# Altium footprint library con-molex.PCBLIB: 369 footprints (part 13 of 26)
Each footprint in its own frame and in the unit in brackets; x right, y up, seen from the top. Pads: shape width x height; smd on the part's side, far side on the other; paste and mask are expansions set on the pad; w line width, h text height; cw(c..) or ccw(c..) is an arc to the next point about the centre after c.
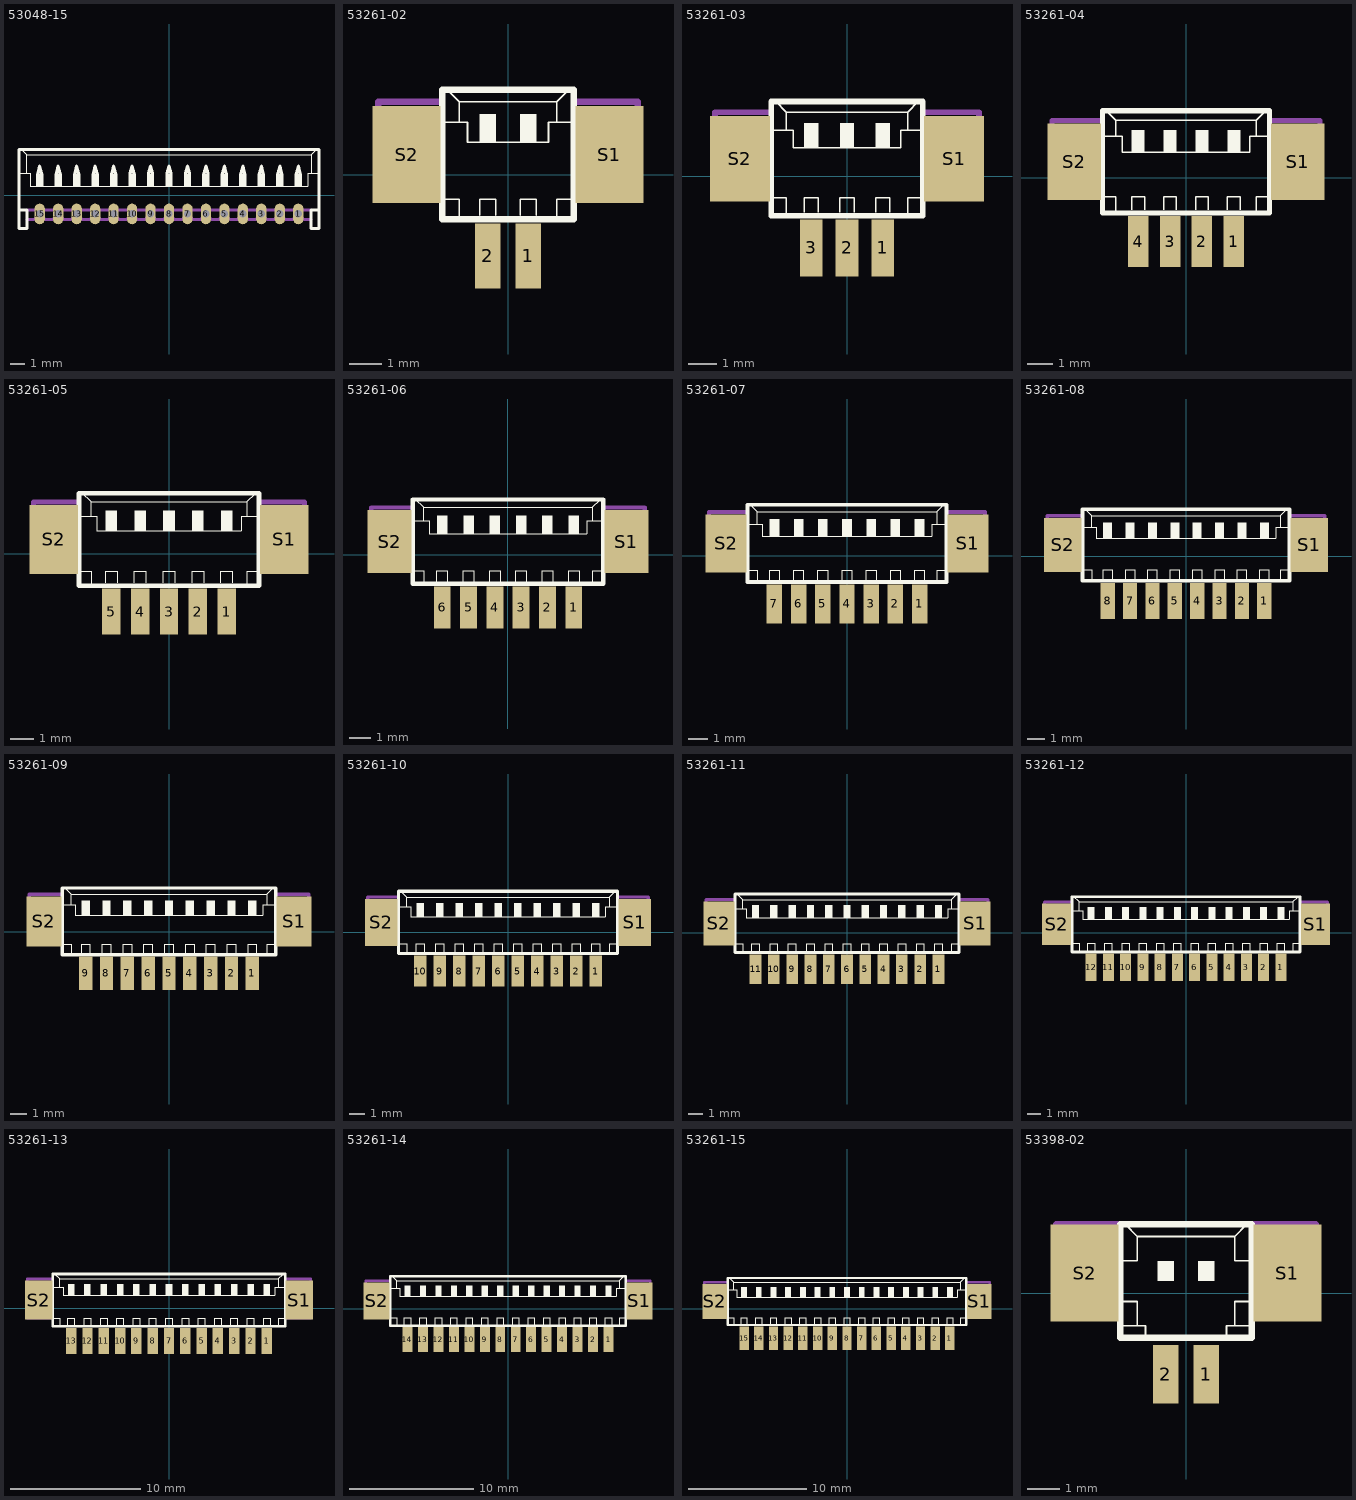
[diagram p12: the footprints below, top view; thin cyan lines are the x and y axes]

## 53048-15 [mil]
pads (15):
  oval 27.5x55 hole 19.69: 1(344.49,-49.21) 2(295.28,-49.21) 3(246.06,-49.21) 4(196.85,-49.21) 5(147.64,-49.21) 6(98.43,-49.21) 7(49.21,-49.21) 8(0,-49.21) 9(-49.21,-49.21) 10(-98.43,-49.21) 11(-147.64,-49.21) 12(-196.85,-49.21) 13(-246.06,-49.21) 14(-295.28,-49.21) 15(-344.49,-49.21)
Top Overlay:
  rectangle: -354.33,24.61 -334.65,59.06
  rectangle: -305.12,24.61 -285.43,59.06
  rectangle: -255.91,24.61 -236.22,59.06
  rectangle: -206.69,24.61 -187.01,59.06
  rectangle: -157.48,24.61 -137.8,59.06
  rectangle: -108.27,24.61 -88.58,59.06
  rectangle: -59.06,24.61 -39.37,59.06
  rectangle: -9.84,24.61 9.84,59.06
  rectangle: 39.37,24.61 59.06,59.06
  rectangle: 88.58,24.61 108.27,59.06
  rectangle: 137.8,24.61 157.48,59.06
  rectangle: 187.01,24.61 206.69,59.06
  rectangle: 236.22,24.61 255.91,59.06
  rectangle: 285.43,24.61 305.12,59.06
  rectangle: 334.65,24.61 354.33,59.06
  lines w2: -398.62,59.06 -378.94,59.06 ; -393.7,123.03 -378.94,108.27 ; 393.7,123.03 378.94,108.27 ; 398.62,59.06 378.94,59.06 ; -378.94,59.06 -369.09,59.06 -369.09,24.61 369.09,24.61 369.09,59.06 378.94,59.06 ; -378.94,59.06 -378.94,108.27 ; -378.94,108.27 378.94,108.27 ; 378.94,59.06 378.94,108.27
  lines w8: -398.62,-39.37 -378.94,-39.37 -378.94,-88.58 -399.61,-88.58 -399.61,123.03 -393.7,123.03 393.7,123.03 399.61,123.03 399.61,-88.58 378.94,-88.58 378.94,-39.37 398.62,-39.37 ; -349.41,59.06 -344.49,78.74 -339.57,59.06 ; -300.2,59.06 -295.28,78.74 -290.35,59.06 ; -250.98,59.06 -246.06,78.74 -241.14,59.06 ; -201.77,59.06 -196.85,78.74 -191.93,59.06 ; -152.56,59.06 -147.64,78.74 -142.72,59.06 ; -103.35,59.06 -98.43,78.74 -93.5,59.06 ; -54.13,59.06 -49.21,78.74 -44.29,59.06 ; -4.92,59.06 0,78.74 4.92,59.06 ; 44.29,59.06 49.21,78.74 54.13,59.06 ; 93.5,59.06 98.43,78.74 103.35,59.06 ; 142.72,59.06 147.64,78.74 152.56,59.06 ; 191.93,59.06 196.85,78.74 201.77,59.06 ; 241.14,59.06 246.06,78.74 250.98,59.06 ; 290.35,59.06 295.28,78.74 300.2,59.06 ; 339.57,59.06 344.49,78.74 349.41,59.06
Mechanical 16:
  rectangle: -354.33,-59.06 -334.65,-39.37
  rectangle: -305.12,-59.06 -285.43,-39.37
  rectangle: -255.91,-59.06 -236.22,-39.37
  rectangle: -206.69,-59.06 -187.01,-39.37
  rectangle: -157.48,-59.06 -137.8,-39.37
  rectangle: -108.27,-59.06 -88.58,-39.37
  rectangle: -59.06,-59.06 -39.37,-39.37
  rectangle: -9.84,-59.06 9.84,-39.37
  rectangle: 39.37,-59.06 59.06,-39.37
  rectangle: 88.58,-59.06 108.27,-39.37
  rectangle: 137.8,-59.06 157.48,-39.37
  rectangle: 187.01,-59.06 206.69,-39.37
  rectangle: 236.22,-59.06 255.91,-39.37
  rectangle: 285.43,-59.06 305.12,-39.37
  rectangle: 334.65,-59.06 354.33,-39.37
  lines w8: -378.94,-63.98 -359.25,-63.98 -354.33,-59.06 ; -378.94,-39.37 378.94,-39.37 ; -334.65,-59.06 -329.72,-63.98 -310.04,-63.98 -305.12,-59.06 ; -285.43,-59.06 -280.51,-63.98 -260.83,-63.98 -255.91,-59.06 ; -236.22,-59.06 -231.3,-63.98 -211.61,-63.98 -206.69,-59.06 ; -187.01,-59.06 -182.09,-63.98 -162.4,-63.98 -157.48,-59.06 ; -137.8,-59.06 -132.87,-63.98 -113.19,-63.98 -108.27,-59.06 ; -88.58,-59.06 -83.66,-63.98 -63.98,-63.98 -59.06,-59.06 ; -39.37,-59.06 -34.45,-63.98 -14.76,-63.98 -9.84,-59.06 ; 9.84,-59.06 14.76,-63.98 34.45,-63.98 39.37,-59.06 ; 59.06,-59.06 63.98,-63.98 83.66,-63.98 88.58,-59.06 ; 108.27,-59.06 113.19,-63.98 132.87,-63.98 137.8,-59.06 ; 157.48,-59.06 162.4,-63.98 182.09,-63.98 187.01,-59.06 ; 206.69,-59.06 211.61,-63.98 231.3,-63.98 236.22,-59.06 ; 255.91,-59.06 260.83,-63.98 280.51,-63.98 285.43,-59.06 ; 305.12,-59.06 310.04,-63.98 329.72,-63.98 334.65,-59.06 ; 354.33,-59.06 359.25,-63.98 378.94,-63.98

## 53261-02 [mm]
pads (4):
  rect 0.8x2 smd: 1(0.625,-2.5) 2(-0.625,-2.5)
  rect 2.1x3 smd: S1(3.125,0.625) S2(-3.125,0.625)
Top Overlay:
  rectangle: -0.875,1 -0.375,1.875
  rectangle: 0.375,1 0.875,1.875
  lines w0.051: -2,-0.75 -1.5,-0.75 -1.5,-1.375 ; -2,1.625 -1.5,1.625 ; -1.875,2.625 -1.5,2.25 ; -0.875,-1.25 -0.875,-0.75 -0.375,-0.75 -0.375,-1.25 ; 0.375,-1.25 0.375,-0.75 0.875,-0.75 0.875,-1.25 ; 1.5,-1.375 1.5,-0.75 2,-0.75 ; 1.875,2.625 1.5,2.25 ; 2,1.625 1.5,1.625 ; -1.5,1.625 -1.25,1.625 -1.25,1 1.25,1 1.25,1.625 1.5,1.625 ; -1.5,1.625 -1.5,2.25 ; -1.5,2.25 1.5,2.25 ; 1.5,1.625 1.5,2.25
  lines w0.203: -2.025,-1.375 -1.5,-1.375 1.5,-1.375 2.025,-1.375 2.025,2.625 1.875,2.625 -1.875,2.625 -2.025,2.625 -2.025,-1.375
Mechanical 16:
  lines w0.203: -2.125,-0.75 -4,-0.75 -4,2.25 -2.125,2.25 ; 2.125,-0.75 4,-0.75 4,2.25 2.125,2.25
  text "1" at 2.5,-0.25 h2.99

## 53261-03 [mm]
pads (5):
  rect 0.8x2 smd: 1(1.25,-2.5) 2(0,-2.5) 3(-1.25,-2.5)
  rect 2.1x3 smd: S1(3.75,0.625) S2(-3.75,0.625)
Top Overlay:
  rectangle: -1.5,1 -1,1.875
  rectangle: -0.25,1 0.25,1.875
  rectangle: 1,1 1.5,1.875
  lines w0.051: -2.625,-0.75 -2.125,-0.75 -2.125,-1.375 ; -2.625,1.625 -2.125,1.625 ; -2.5,2.625 -2.125,2.25 ; -1.5,-1.25 -1.5,-0.75 -1,-0.75 -1,-1.25 ; -0.25,-1.25 -0.25,-0.75 0.25,-0.75 0.25,-1.25 ; 1,-1.25 1,-0.75 1.5,-0.75 1.5,-1.25 ; 2.125,-1.375 2.125,-0.75 2.625,-0.75 ; 2.5,2.625 2.125,2.25 ; 2.625,1.625 2.125,1.625 ; -2.125,1.625 -1.875,1.625 -1.875,1 1.875,1 1.875,1.625 2.125,1.625 ; -2.125,1.625 -2.125,2.25 ; -2.125,2.25 2.125,2.25 ; 2.125,1.625 2.125,2.25
  lines w0.203: -2.65,-1.375 -2.125,-1.375 2.125,-1.375 2.65,-1.375 2.65,2.625 2.5,2.625 -2.5,2.625 -2.65,2.625 -2.65,-1.375
Mechanical 16:
  lines w0.203: -2.75,-0.75 -4.625,-0.75 -4.625,2.25 -2.75,2.25 ; 2.75,-0.75 4.625,-0.75 4.625,2.25 2.75,2.25
  text "1" at 3.125,-0.25 h2.99

## 53261-04 [mm]
pads (6):
  rect 0.8x2 smd: 1(1.875,-2.5) 2(0.625,-2.5) 3(-0.625,-2.5) 4(-1.875,-2.5)
  rect 2.1x3 smd: S1(4.375,0.625) S2(-4.375,0.625)
Top Overlay:
  rectangle: -2.125,1 -1.625,1.875
  rectangle: -0.875,1 -0.375,1.875
  rectangle: 0.375,1 0.875,1.875
  rectangle: 1.625,1 2.125,1.875
  lines w0.051: -3.25,-0.75 -2.75,-0.75 -2.75,-1.375 ; -3.25,1.625 -2.75,1.625 ; -3.125,2.625 -2.75,2.25 ; -2.125,-1.25 -2.125,-0.75 -1.625,-0.75 -1.625,-1.25 ; -0.875,-1.25 -0.875,-0.75 -0.375,-0.75 -0.375,-1.25 ; 0.375,-1.25 0.375,-0.75 0.875,-0.75 0.875,-1.25 ; 1.625,-1.25 1.625,-0.75 2.125,-0.75 2.125,-1.25 ; 2.75,-1.375 2.75,-0.75 3.25,-0.75 ; 3.125,2.625 2.75,2.25 ; 3.25,1.625 2.75,1.625 ; -2.75,1.625 -2.5,1.625 -2.5,1 2.5,1 2.5,1.625 2.75,1.625 ; -2.75,1.625 -2.75,2.25 ; -2.75,2.25 2.75,2.25 ; 2.75,1.625 2.75,2.25
  lines w0.203: -3.275,-1.375 -2.75,-1.375 2.75,-1.375 3.275,-1.375 3.275,2.625 3.125,2.625 -3.125,2.625 -3.275,2.625 -3.275,-1.375
Mechanical 16:
  lines w0.203: -3.375,-0.75 -5.25,-0.75 -5.25,2.25 -3.375,2.25 ; 3.375,-0.75 5.25,-0.75 5.25,2.25 3.375,2.25
  text "1" at 3.75,-0.25 h2.99

## 53261-05 [mm]
pads (7):
  rect 0.8x2 smd: 1(2.5,-2.5) 2(1.25,-2.5) 3(0,-2.5) 4(-1.25,-2.5) 5(-2.5,-2.5)
  rect 2.1x3 smd: S1(5,0.625) S2(-5,0.625)
Top Overlay:
  rectangle: -2.75,1 -2.25,1.875
  rectangle: -1.5,1 -1,1.875
  rectangle: -0.25,1 0.25,1.875
  rectangle: 1,1 1.5,1.875
  rectangle: 2.25,1 2.75,1.875
  lines w0.051: -3.875,-0.75 -3.375,-0.75 -3.375,-1.375 ; -3.875,1.625 -3.375,1.625 ; -3.75,2.625 -3.375,2.25 ; -2.75,-1.25 -2.75,-0.75 -2.25,-0.75 -2.25,-1.25 ; -1.5,-1.25 -1.5,-0.75 -1,-0.75 -1,-1.25 ; -0.25,-1.25 -0.25,-0.75 0.25,-0.75 0.25,-1.25 ; 1,-1.25 1,-0.75 1.5,-0.75 1.5,-1.25 ; 2.25,-1.25 2.25,-0.75 2.75,-0.75 2.75,-1.25 ; 3.375,-1.375 3.375,-0.75 3.875,-0.75 ; 3.75,2.625 3.375,2.25 ; 3.875,1.625 3.375,1.625 ; -3.375,1.625 -3.125,1.625 -3.125,1 3.125,1 3.125,1.625 3.375,1.625 ; -3.375,1.625 -3.375,2.25 ; -3.375,2.25 3.375,2.25 ; 3.375,1.625 3.375,2.25
  lines w0.203: -3.9,-1.375 -3.375,-1.375 3.375,-1.375 3.9,-1.375 3.9,2.625 3.75,2.625 -3.75,2.625 -3.9,2.625 -3.9,-1.375
Mechanical 16:
  lines w0.203: -4,-0.75 -5.875,-0.75 -5.875,2.25 -4,2.25 ; 4,-0.75 5.875,-0.75 5.875,2.25 4,2.25
  text "1" at 4.375,-0.25 h2.99

## 53261-06 [mm]
pads (8):
  rect 0.8x2 smd: 1(3.125,-2.5) 2(1.875,-2.5) 3(0.625,-2.5) 4(-0.625,-2.5) 5(-1.875,-2.5) 6(-3.125,-2.5)
  rect 2.1x3 smd: S1(5.625,0.625) S2(-5.625,0.625)
Top Overlay:
  rectangle: -3.375,1 -2.875,1.875
  rectangle: -2.125,1 -1.625,1.875
  rectangle: -0.875,1 -0.375,1.875
  rectangle: 0.375,1 0.875,1.875
  rectangle: 1.625,1 2.125,1.875
  rectangle: 2.875,1 3.375,1.875
  lines w0.051: -4.5,-0.75 -4,-0.75 -4,-1.375 ; -4.5,1.625 -4,1.625 ; -4.375,2.625 -4,2.25 ; -3.375,-1.25 -3.375,-0.75 -2.875,-0.75 -2.875,-1.25 ; -2.125,-1.25 -2.125,-0.75 -1.625,-0.75 -1.625,-1.25 ; -0.875,-1.25 -0.875,-0.75 -0.375,-0.75 -0.375,-1.25 ; 0.375,-1.25 0.375,-0.75 0.875,-0.75 0.875,-1.25 ; 1.625,-1.25 1.625,-0.75 2.125,-0.75 2.125,-1.25 ; 2.875,-1.25 2.875,-0.75 3.375,-0.75 3.375,-1.25 ; 4,-1.375 4,-0.75 4.5,-0.75 ; 4.375,2.625 4,2.25 ; 4.5,1.625 4,1.625 ; -4,1.625 -3.75,1.625 -3.75,1 3.75,1 3.75,1.625 4,1.625 ; -4,1.625 -4,2.25 ; -4,2.25 4,2.25 ; 4,1.625 4,2.25
  lines w0.203: -4.525,-1.375 -4,-1.375 4,-1.375 4.525,-1.375 4.525,2.625 4.375,2.625 -4.375,2.625 -4.525,2.625 -4.525,-1.375
Mechanical 16:
  lines w0.203: -4.625,-0.75 -6.5,-0.75 -6.5,2.25 -4.625,2.25 ; 4.625,-0.75 6.5,-0.75 6.5,2.25 4.625,2.25
  text "1" at 5,-0.25 h2.99

## 53261-07 [mm]
pads (9):
  rect 0.8x2 smd: 1(3.75,-2.5) 2(2.5,-2.5) 3(1.25,-2.5) 4(0,-2.5) 5(-1.25,-2.5) 6(-2.5,-2.5) 7(-3.75,-2.5)
  rect 2.1x3 smd: S1(6.25,0.625) S2(-6.25,0.625)
Top Overlay:
  rectangle: -4,1 -3.5,1.875
  rectangle: -2.75,1 -2.25,1.875
  rectangle: -1.5,1 -1,1.875
  rectangle: -0.25,1 0.25,1.875
  rectangle: 1,1 1.5,1.875
  rectangle: 2.25,1 2.75,1.875
  rectangle: 3.5,1 4,1.875
  lines w0.051: -5.125,-0.75 -4.625,-0.75 -4.625,-1.375 ; -5.125,1.625 -4.625,1.625 ; -5,2.625 -4.625,2.25 ; -4,-1.25 -4,-0.75 -3.5,-0.75 -3.5,-1.25 ; -2.75,-1.25 -2.75,-0.75 -2.25,-0.75 -2.25,-1.25 ; -1.5,-1.25 -1.5,-0.75 -1,-0.75 -1,-1.25 ; -0.25,-1.25 -0.25,-0.75 0.25,-0.75 0.25,-1.25 ; 1,-1.25 1,-0.75 1.5,-0.75 1.5,-1.25 ; 2.25,-1.25 2.25,-0.75 2.75,-0.75 2.75,-1.25 ; 3.5,-1.25 3.5,-0.75 4,-0.75 4,-1.25 ; 4.625,-1.375 4.625,-0.75 5.125,-0.75 ; 5,2.625 4.625,2.25 ; 5.125,1.625 4.625,1.625 ; -4.625,1.625 -4.375,1.625 -4.375,1 4.375,1 4.375,1.625 4.625,1.625 ; -4.625,1.625 -4.625,2.25 ; -4.625,2.25 4.625,2.25 ; 4.625,1.625 4.625,2.25
  lines w0.203: -5.15,-1.375 -4.625,-1.375 4.625,-1.375 5.15,-1.375 5.15,2.625 5,2.625 -5,2.625 -5.15,2.625 -5.15,-1.375
Mechanical 16:
  lines w0.203: -5.25,-0.75 -7.125,-0.75 -7.125,2.25 -5.25,2.25 ; 5.25,-0.75 7.125,-0.75 7.125,2.25 5.25,2.25
  text "1" at 5.75,-0.25 h2.99

## 53261-08 [mm]
pads (10):
  rect 0.8x2 smd: 1(4.375,-2.5) 2(3.125,-2.5) 3(1.875,-2.5) 4(0.625,-2.5) 5(-0.625,-2.5) 6(-1.875,-2.5) 7(-3.125,-2.5) 8(-4.375,-2.5)
  rect 2.1x3 smd: S1(6.875,0.625) S2(-6.875,0.625)
Top Overlay:
  rectangle: -4.625,1 -4.125,1.875
  rectangle: -3.375,1 -2.875,1.875
  rectangle: -2.125,1 -1.625,1.875
  rectangle: -0.875,1 -0.375,1.875
  rectangle: 0.375,1 0.875,1.875
  rectangle: 1.625,1 2.125,1.875
  rectangle: 2.875,1 3.375,1.875
  rectangle: 4.125,1 4.625,1.875
  lines w0.051: -5.75,-0.75 -5.25,-0.75 -5.25,-1.375 ; -5.75,1.625 -5.25,1.625 ; -5.625,2.625 -5.25,2.25 ; -4.625,-1.25 -4.625,-0.75 -4.125,-0.75 -4.125,-1.25 ; -3.375,-1.25 -3.375,-0.75 -2.875,-0.75 -2.875,-1.25 ; -2.125,-1.25 -2.125,-0.75 -1.625,-0.75 -1.625,-1.25 ; -0.875,-1.25 -0.875,-0.75 -0.375,-0.75 -0.375,-1.25 ; 0.375,-1.25 0.375,-0.75 0.875,-0.75 0.875,-1.25 ; 1.625,-1.25 1.625,-0.75 2.125,-0.75 2.125,-1.25 ; 2.875,-1.25 2.875,-0.75 3.375,-0.75 3.375,-1.25 ; 4.125,-1.25 4.125,-0.75 4.625,-0.75 4.625,-1.25 ; 5.25,-1.375 5.25,-0.75 5.75,-0.75 ; 5.625,2.625 5.25,2.25 ; 5.75,1.625 5.25,1.625 ; -5.25,1.625 -5,1.625 -5,1 5,1 5,1.625 5.25,1.625 ; -5.25,1.625 -5.25,2.25 ; -5.25,2.25 5.25,2.25 ; 5.25,1.625 5.25,2.25
  lines w0.203: -5.775,-1.375 -5.25,-1.375 5.25,-1.375 5.775,-1.375 5.775,2.625 5.625,2.625 -5.625,2.625 -5.775,2.625 -5.775,-1.375
Mechanical 16:
  lines w0.203: -5.875,-0.75 -7.75,-0.75 -7.75,2.25 -5.875,2.25 ; 5.875,-0.75 7.75,-0.75 7.75,2.25 5.875,2.25
  text "1" at 6.25,-0.25 h2.99

## 53261-09 [mm]
pads (11):
  rect 0.8x2 smd: 1(5,-2.5) 2(3.75,-2.5) 3(2.5,-2.5) 4(1.25,-2.5) 5(0,-2.5) 6(-1.25,-2.5) 7(-2.5,-2.5) 8(-3.75,-2.5) 9(-5,-2.5)
  rect 2.1x3 smd: S1(7.5,0.625) S2(-7.5,0.625)
Top Overlay:
  rectangle: -5.25,1 -4.75,1.875
  rectangle: -4,1 -3.5,1.875
  rectangle: -2.75,1 -2.25,1.875
  rectangle: -1.5,1 -1,1.875
  rectangle: -0.25,1 0.25,1.875
  rectangle: 1,1 1.5,1.875
  rectangle: 2.25,1 2.75,1.875
  rectangle: 3.5,1 4,1.875
  rectangle: 4.75,1 5.25,1.875
  lines w0.051: -6.375,-0.75 -5.875,-0.75 -5.875,-1.375 ; -6.375,1.625 -5.875,1.625 ; -6.25,2.625 -5.875,2.25 ; -5.25,-1.25 -5.25,-0.75 -4.75,-0.75 -4.75,-1.25 ; -4,-1.25 -4,-0.75 -3.5,-0.75 -3.5,-1.25 ; -2.75,-1.25 -2.75,-0.75 -2.25,-0.75 -2.25,-1.25 ; -1.5,-1.25 -1.5,-0.75 -1,-0.75 -1,-1.25 ; -0.25,-1.25 -0.25,-0.75 0.25,-0.75 0.25,-1.25 ; 1,-1.25 1,-0.75 1.5,-0.75 1.5,-1.25 ; 2.25,-1.25 2.25,-0.75 2.75,-0.75 2.75,-1.25 ; 3.5,-1.25 3.5,-0.75 4,-0.75 4,-1.25 ; 4.75,-1.25 4.75,-0.75 5.25,-0.75 5.25,-1.25 ; 5.875,-1.375 5.875,-0.75 6.375,-0.75 ; 6.25,2.625 5.875,2.25 ; 6.375,1.625 5.875,1.625 ; -5.875,1.625 -5.625,1.625 -5.625,1 5.625,1 5.625,1.625 5.875,1.625 ; -5.875,1.625 -5.875,2.25 ; -5.875,2.25 5.875,2.25 ; 5.875,1.625 5.875,2.25
  lines w0.203: -6.4,-1.375 -5.875,-1.375 5.875,-1.375 6.4,-1.375 6.4,2.625 6.25,2.625 -6.25,2.625 -6.4,2.625 -6.4,-1.375
Mechanical 16:
  lines w0.203: -6.5,-0.75 -8.375,-0.75 -8.375,2.25 -6.5,2.25 ; 6.5,-0.75 8.375,-0.75 8.375,2.25 6.5,2.25
  text "1" at 6.875,-0.25 h2.99

## 53261-10 [mm]
pads (12):
  rect 0.8x2 smd: 1(5.625,-2.5) 2(4.375,-2.5) 3(3.125,-2.5) 4(1.875,-2.5) 5(0.625,-2.5) 6(-0.625,-2.5) 7(-1.875,-2.5) 8(-3.125,-2.5) 9(-4.375,-2.5) 10(-5.625,-2.5)
  rect 2.1x3 smd: S1(8.125,0.625) S2(-8.125,0.625)
Top Overlay:
  rectangle: -5.875,1 -5.375,1.875
  rectangle: -4.625,1 -4.125,1.875
  rectangle: -3.375,1 -2.875,1.875
  rectangle: -2.125,1 -1.625,1.875
  rectangle: -0.875,1 -0.375,1.875
  rectangle: 0.375,1 0.875,1.875
  rectangle: 1.625,1 2.125,1.875
  rectangle: 2.875,1 3.375,1.875
  rectangle: 4.125,1 4.625,1.875
  rectangle: 5.375,1 5.875,1.875
  lines w0.051: -7,-0.75 -6.5,-0.75 -6.5,-1.375 ; -7,1.625 -6.5,1.625 ; -6.875,2.625 -6.5,2.25 ; -5.875,-1.25 -5.875,-0.75 -5.375,-0.75 -5.375,-1.25 ; -4.625,-1.25 -4.625,-0.75 -4.125,-0.75 -4.125,-1.25 ; -3.375,-1.25 -3.375,-0.75 -2.875,-0.75 -2.875,-1.25 ; -2.125,-1.25 -2.125,-0.75 -1.625,-0.75 -1.625,-1.25 ; -0.875,-1.25 -0.875,-0.75 -0.375,-0.75 -0.375,-1.25 ; 0.375,-1.25 0.375,-0.75 0.875,-0.75 0.875,-1.25 ; 1.625,-1.25 1.625,-0.75 2.125,-0.75 2.125,-1.25 ; 2.875,-1.25 2.875,-0.75 3.375,-0.75 3.375,-1.25 ; 4.125,-1.25 4.125,-0.75 4.625,-0.75 4.625,-1.25 ; 5.375,-1.25 5.375,-0.75 5.875,-0.75 5.875,-1.25 ; 6.5,-1.375 6.5,-0.75 7,-0.75 ; 6.875,2.625 6.5,2.25 ; 7,1.625 6.5,1.625 ; -6.5,1.625 -6.25,1.625 -6.25,1 6.25,1 6.25,1.625 6.5,1.625 ; -6.5,1.625 -6.5,2.25 ; -6.5,2.25 6.5,2.25 ; 6.5,1.625 6.5,2.25
  lines w0.203: -7.025,-1.375 -6.5,-1.375 6.5,-1.375 7.025,-1.375 7.025,2.625 6.875,2.625 -6.875,2.625 -7.025,2.625 -7.025,-1.375
Mechanical 16:
  lines w0.203: -7.125,-0.75 -9,-0.75 -9,2.25 -7.125,2.25 ; 7.125,-0.75 9,-0.75 9,2.25 7.125,2.25
  text "1" at 7.5,-0.25 h2.99

## 53261-11 [mm]
pads (13):
  rect 0.8x2 smd: 1(6.25,-2.5) 2(5,-2.5) 3(3.75,-2.5) 4(2.5,-2.5) 5(1.25,-2.5) 6(0,-2.5) 7(-1.25,-2.5) 8(-2.5,-2.5) 9(-3.75,-2.5) 10(-5,-2.5) 11(-6.25,-2.5)
  rect 2.1x3 smd: S1(8.75,0.625) S2(-8.75,0.625)
Top Overlay:
  rectangle: -6.5,1 -6,1.875
  rectangle: -5.25,1 -4.75,1.875
  rectangle: -4,1 -3.5,1.875
  rectangle: -2.75,1 -2.25,1.875
  rectangle: -1.5,1 -1,1.875
  rectangle: -0.25,1 0.25,1.875
  rectangle: 1,1 1.5,1.875
  rectangle: 2.25,1 2.75,1.875
  rectangle: 3.5,1 4,1.875
  rectangle: 4.75,1 5.25,1.875
  rectangle: 6,1 6.5,1.875
  lines w0.051: -7.625,-0.75 -7.125,-0.75 -7.125,-1.375 ; -7.625,1.625 -7.125,1.625 ; -7.5,2.625 -7.125,2.25 ; -6.5,-1.25 -6.5,-0.75 -6,-0.75 -6,-1.25 ; -5.25,-1.25 -5.25,-0.75 -4.75,-0.75 -4.75,-1.25 ; -4,-1.25 -4,-0.75 -3.5,-0.75 -3.5,-1.25 ; -2.75,-1.25 -2.75,-0.75 -2.25,-0.75 -2.25,-1.25 ; -1.5,-1.25 -1.5,-0.75 -1,-0.75 -1,-1.25 ; -0.25,-1.25 -0.25,-0.75 0.25,-0.75 0.25,-1.25 ; 1,-1.25 1,-0.75 1.5,-0.75 1.5,-1.25 ; 2.25,-1.25 2.25,-0.75 2.75,-0.75 2.75,-1.25 ; 3.5,-1.25 3.5,-0.75 4,-0.75 4,-1.25 ; 4.75,-1.25 4.75,-0.75 5.25,-0.75 5.25,-1.25 ; 6,-1.25 6,-0.75 6.5,-0.75 6.5,-1.25 ; 7.125,-1.375 7.125,-0.75 7.625,-0.75 ; 7.5,2.625 7.125,2.25 ; 7.625,1.625 7.125,1.625 ; -7.125,1.625 -6.875,1.625 -6.875,1 6.875,1 6.875,1.625 7.125,1.625 ; -7.125,1.625 -7.125,2.25 ; -7.125,2.25 7.125,2.25 ; 7.125,1.625 7.125,2.25
  lines w0.203: -7.65,-1.375 -7.125,-1.375 7.125,-1.375 7.65,-1.375 7.65,2.625 7.5,2.625 -7.5,2.625 -7.65,2.625 -7.65,-1.375
Mechanical 16:
  lines w0.203: -7.75,-0.75 -9.625,-0.75 -9.625,2.25 -7.75,2.25 ; 7.75,-0.75 9.625,-0.75 9.625,2.25 7.75,2.25
  text "1" at 8.25,-0.25 h2.99

## 53261-12 [mm]
pads (14):
  rect 0.8x2 smd: 1(6.875,-2.5) 2(5.625,-2.5) 3(4.375,-2.5) 4(3.125,-2.5) 5(1.875,-2.5) 6(0.625,-2.5) 7(-0.625,-2.5) 8(-1.875,-2.5) 9(-3.125,-2.5) 10(-4.375,-2.5) 11(-5.625,-2.5) 12(-6.875,-2.5)
  rect 2.1x3 smd: S1(9.375,0.625) S2(-9.375,0.625)
Top Overlay:
  rectangle: -7.125,1 -6.625,1.875
  rectangle: -5.875,1 -5.375,1.875
  rectangle: -4.625,1 -4.125,1.875
  rectangle: -3.375,1 -2.875,1.875
  rectangle: -2.125,1 -1.625,1.875
  rectangle: -0.875,1 -0.375,1.875
  rectangle: 0.375,1 0.875,1.875
  rectangle: 1.625,1 2.125,1.875
  rectangle: 2.875,1 3.375,1.875
  rectangle: 4.125,1 4.625,1.875
  rectangle: 5.375,1 5.875,1.875
  rectangle: 6.625,1 7.125,1.875
  lines w0.051: -8.25,-0.75 -7.75,-0.75 -7.75,-1.375 ; -8.25,1.625 -7.75,1.625 ; -8.125,2.625 -7.75,2.25 ; -7.125,-1.25 -7.125,-0.75 -6.625,-0.75 -6.625,-1.25 ; -5.875,-1.25 -5.875,-0.75 -5.375,-0.75 -5.375,-1.25 ; -4.625,-1.25 -4.625,-0.75 -4.125,-0.75 -4.125,-1.25 ; -3.375,-1.25 -3.375,-0.75 -2.875,-0.75 -2.875,-1.25 ; -2.125,-1.25 -2.125,-0.75 -1.625,-0.75 -1.625,-1.25 ; -0.875,-1.25 -0.875,-0.75 -0.375,-0.75 -0.375,-1.25 ; 0.375,-1.25 0.375,-0.75 0.875,-0.75 0.875,-1.25 ; 1.625,-1.25 1.625,-0.75 2.125,-0.75 2.125,-1.25 ; 2.875,-1.25 2.875,-0.75 3.375,-0.75 3.375,-1.25 ; 4.125,-1.25 4.125,-0.75 4.625,-0.75 4.625,-1.25 ; 5.375,-1.25 5.375,-0.75 5.875,-0.75 5.875,-1.25 ; 6.625,-1.25 6.625,-0.75 7.125,-0.75 7.125,-1.25 ; 7.75,-1.375 7.75,-0.75 8.25,-0.75 ; 8.125,2.625 7.75,2.25 ; 8.25,1.625 7.75,1.625 ; -7.75,1.625 -7.5,1.625 -7.5,1 7.5,1 7.5,1.625 7.75,1.625 ; -7.75,1.625 -7.75,2.25 ; -7.75,2.25 7.75,2.25 ; 7.75,1.625 7.75,2.25
  lines w0.203: -8.275,-1.375 -7.75,-1.375 7.75,-1.375 8.275,-1.375 8.275,2.625 8.125,2.625 -8.125,2.625 -8.275,2.625 -8.275,-1.375
Mechanical 16:
  lines w0.203: -8.375,-0.75 -10.25,-0.75 -10.25,2.25 -8.375,2.25 ; 8.375,-0.75 10.25,-0.75 10.25,2.25 8.375,2.25
  text "1" at 8.75,-0.25 h2.99

## 53261-13 [mm]
pads (15):
  rect 0.8x2 smd: 1(7.5,-2.5) 2(6.25,-2.5) 3(5,-2.5) 4(3.75,-2.5) 5(2.5,-2.5) 6(1.25,-2.5) 7(0,-2.5) 8(-1.25,-2.5) 9(-2.5,-2.5) 10(-3.75,-2.5) 11(-5,-2.5) 12(-6.25,-2.5) 13(-7.5,-2.5)
  rect 2.1x3 smd: S1(10,0.625) S2(-10,0.625)
Top Overlay:
  rectangle: -7.75,1 -7.25,1.875
  rectangle: -6.5,1 -6,1.875
  rectangle: -5.25,1 -4.75,1.875
  rectangle: -4,1 -3.5,1.875
  rectangle: -2.75,1 -2.25,1.875
  rectangle: -1.5,1 -1,1.875
  rectangle: -0.25,1 0.25,1.875
  rectangle: 1,1 1.5,1.875
  rectangle: 2.25,1 2.75,1.875
  rectangle: 3.5,1 4,1.875
  rectangle: 4.75,1 5.25,1.875
  rectangle: 6,1 6.5,1.875
  rectangle: 7.25,1 7.75,1.875
  lines w0.051: -8.875,-0.75 -8.375,-0.75 -8.375,-1.375 ; -8.875,1.625 -8.375,1.625 ; -8.75,2.625 -8.375,2.25 ; -7.75,-1.25 -7.75,-0.75 -7.25,-0.75 -7.25,-1.25 ; -6.5,-1.25 -6.5,-0.75 -6,-0.75 -6,-1.25 ; -5.25,-1.25 -5.25,-0.75 -4.75,-0.75 -4.75,-1.25 ; -4,-1.25 -4,-0.75 -3.5,-0.75 -3.5,-1.25 ; -2.75,-1.25 -2.75,-0.75 -2.25,-0.75 -2.25,-1.25 ; -1.5,-1.25 -1.5,-0.75 -1,-0.75 -1,-1.25 ; -0.25,-1.25 -0.25,-0.75 0.25,-0.75 0.25,-1.25 ; 1,-1.25 1,-0.75 1.5,-0.75 1.5,-1.25 ; 2.25,-1.25 2.25,-0.75 2.75,-0.75 2.75,-1.25 ; 3.5,-1.25 3.5,-0.75 4,-0.75 4,-1.25 ; 4.75,-1.25 4.75,-0.75 5.25,-0.75 5.25,-1.25 ; 6,-1.25 6,-0.75 6.5,-0.75 6.5,-1.25 ; 7.25,-1.25 7.25,-0.75 7.75,-0.75 7.75,-1.25 ; 8.375,-1.375 8.375,-0.75 8.875,-0.75 ; 8.75,2.625 8.375,2.25 ; 8.875,1.625 8.375,1.625 ; -8.375,1.625 -8.125,1.625 -8.125,1 8.125,1 8.125,1.625 8.375,1.625 ; -8.375,1.625 -8.375,2.25 ; -8.375,2.25 8.375,2.25 ; 8.375,1.625 8.375,2.25
  lines w0.203: -8.9,-1.375 -8.375,-1.375 8.375,-1.375 8.9,-1.375 8.9,2.625 8.75,2.625 -8.75,2.625 -8.9,2.625 -8.9,-1.375
Mechanical 16:
  lines w0.203: -9,-0.75 -10.875,-0.75 -10.875,2.25 -9,2.25 ; 9,-0.75 10.875,-0.75 10.875,2.25 9,2.25
  text "1" at 9.5,-0.25 h2.99

## 53261-14 [mm]
pads (16):
  rect 0.8x2 smd: 1(8.125,-2.5) 2(6.875,-2.5) 3(5.625,-2.5) 4(4.375,-2.5) 5(3.125,-2.5) 6(1.875,-2.5) 7(0.625,-2.5) 8(-0.625,-2.5) 9(-1.875,-2.5) 10(-3.125,-2.5) 11(-4.375,-2.5) 12(-5.625,-2.5) 13(-6.875,-2.5) 14(-8.125,-2.5)
  rect 2.1x3 smd: S1(10.625,0.625) S2(-10.625,0.625)
Top Overlay:
  rectangle: -8.375,1 -7.875,1.875
  rectangle: -7.125,1 -6.625,1.875
  rectangle: -5.875,1 -5.375,1.875
  rectangle: -4.625,1 -4.125,1.875
  rectangle: -3.375,1 -2.875,1.875
  rectangle: -2.125,1 -1.625,1.875
  rectangle: -0.875,1 -0.375,1.875
  rectangle: 0.375,1 0.875,1.875
  rectangle: 1.625,1 2.125,1.875
  rectangle: 2.875,1 3.375,1.875
  rectangle: 4.125,1 4.625,1.875
  rectangle: 5.375,1 5.875,1.875
  rectangle: 6.625,1 7.125,1.875
  rectangle: 7.875,1 8.375,1.875
  lines w0.051: -9.5,-0.75 -9,-0.75 -9,-1.375 ; -9.5,1.625 -9,1.625 ; -9.375,2.625 -9,2.25 ; -8.375,-1.25 -8.375,-0.75 -7.875,-0.75 -7.875,-1.25 ; -7.125,-1.25 -7.125,-0.75 -6.625,-0.75 -6.625,-1.25 ; -5.875,-1.25 -5.875,-0.75 -5.375,-0.75 -5.375,-1.25 ; -4.625,-1.25 -4.625,-0.75 -4.125,-0.75 -4.125,-1.25 ; -3.375,-1.25 -3.375,-0.75 -2.875,-0.75 -2.875,-1.25 ; -2.125,-1.25 -2.125,-0.75 -1.625,-0.75 -1.625,-1.25 ; -0.875,-1.25 -0.875,-0.75 -0.375,-0.75 -0.375,-1.25 ; 0.375,-1.25 0.375,-0.75 0.875,-0.75 0.875,-1.25 ; 1.625,-1.25 1.625,-0.75 2.125,-0.75 2.125,-1.25 ; 2.875,-1.25 2.875,-0.75 3.375,-0.75 3.375,-1.25 ; 4.125,-1.25 4.125,-0.75 4.625,-0.75 4.625,-1.25 ; 5.375,-1.25 5.375,-0.75 5.875,-0.75 5.875,-1.25 ; 6.625,-1.25 6.625,-0.75 7.125,-0.75 7.125,-1.25 ; 7.875,-1.25 7.875,-0.75 8.375,-0.75 8.375,-1.25 ; 9,-1.375 9,-0.75 9.5,-0.75 ; 9.375,2.625 9,2.25 ; 9.5,1.625 9,1.625 ; -9,1.625 -8.75,1.625 -8.75,1 8.75,1 8.75,1.625 9,1.625 ; -9,1.625 -9,2.25 ; -9,2.25 9,2.25 ; 9,1.625 9,2.25
  lines w0.203: -9.525,-1.375 -9,-1.375 9,-1.375 9.525,-1.375 9.525,2.625 9.375,2.625 -9.375,2.625 -9.525,2.625 -9.525,-1.375
Mechanical 16:
  lines w0.203: -9.625,-0.75 -11.5,-0.75 -11.5,2.25 -9.625,2.25 ; 9.625,-0.75 11.5,-0.75 11.5,2.25 9.625,2.25
  text "1" at 10,-0.25 h2.99

## 53261-15 [mm]
pads (17):
  rect 0.8x2 smd: 1(8.75,-2.5) 2(7.5,-2.5) 3(6.25,-2.5) 4(5,-2.5) 5(3.75,-2.5) 6(2.5,-2.5) 7(1.25,-2.5) 8(0,-2.5) 9(-1.25,-2.5) 10(-2.5,-2.5) 11(-3.75,-2.5) 12(-5,-2.5) 13(-6.25,-2.5) 14(-7.5,-2.5) 15(-8.75,-2.5)
  rect 2.1x3 smd: S1(11.25,0.625) S2(-11.25,0.625)
Top Overlay:
  rectangle: -9,1 -8.5,1.875
  rectangle: -7.75,1 -7.25,1.875
  rectangle: -6.5,1 -6,1.875
  rectangle: -5.25,1 -4.75,1.875
  rectangle: -4,1 -3.5,1.875
  rectangle: -2.75,1 -2.25,1.875
  rectangle: -1.5,1 -1,1.875
  rectangle: -0.25,1 0.25,1.875
  rectangle: 1,1 1.5,1.875
  rectangle: 2.25,1 2.75,1.875
  rectangle: 3.5,1 4,1.875
  rectangle: 4.75,1 5.25,1.875
  rectangle: 6,1 6.5,1.875
  rectangle: 7.25,1 7.75,1.875
  rectangle: 8.5,1 9,1.875
  lines w0.051: -10.125,-0.75 -9.625,-0.75 -9.625,-1.375 ; -10.125,1.625 -9.625,1.625 ; -10,2.625 -9.625,2.25 ; -9,-1.25 -9,-0.75 -8.5,-0.75 -8.5,-1.25 ; -7.75,-1.25 -7.75,-0.75 -7.25,-0.75 -7.25,-1.25 ; -6.5,-1.25 -6.5,-0.75 -6,-0.75 -6,-1.25 ; -5.25,-1.25 -5.25,-0.75 -4.75,-0.75 -4.75,-1.25 ; -4,-1.25 -4,-0.75 -3.5,-0.75 -3.5,-1.25 ; -2.75,-1.25 -2.75,-0.75 -2.25,-0.75 -2.25,-1.25 ; -1.5,-1.25 -1.5,-0.75 -1,-0.75 -1,-1.25 ; -0.25,-1.25 -0.25,-0.75 0.25,-0.75 0.25,-1.25 ; 1,-1.25 1,-0.75 1.5,-0.75 1.5,-1.25 ; 2.25,-1.25 2.25,-0.75 2.75,-0.75 2.75,-1.25 ; 3.5,-1.25 3.5,-0.75 4,-0.75 4,-1.25 ; 4.75,-1.25 4.75,-0.75 5.25,-0.75 5.25,-1.25 ; 6,-1.25 6,-0.75 6.5,-0.75 6.5,-1.25 ; 7.25,-1.25 7.25,-0.75 7.75,-0.75 7.75,-1.25 ; 8.5,-1.25 8.5,-0.75 9,-0.75 9,-1.25 ; 9.625,-1.375 9.625,-0.75 10.125,-0.75 ; 10,2.625 9.625,2.25 ; 10.125,1.625 9.625,1.625 ; -9.625,1.625 -9.375,1.625 -9.375,1 9.375,1 9.375,1.625 9.625,1.625 ; -9.625,1.625 -9.625,2.25 ; -9.625,2.25 9.625,2.25 ; 9.625,1.625 9.625,2.25
  lines w0.203: -10.15,-1.375 -9.625,-1.375 9.625,-1.375 10.15,-1.375 10.15,2.625 10,2.625 -10,2.625 -10.15,2.625 -10.15,-1.375
Mechanical 16:
  lines w0.203: -10.25,-0.75 -12.125,-0.75 -12.125,2.25 -10.25,2.25 ; 10.25,-0.75 12.125,-0.75 12.125,2.25 10.25,2.25
  text "1" at 10.75,-0.25 h2.99

## 53398-02 [mm]
pads (4):
  rect 0.8x1.8 smd: 1(0.625,-2.5) 2(-0.625,-2.5)
  rect 2.1x3 smd: S1(3.125,0.625) S2(-3.125,0.625)
Top Overlay:
  rectangle: -0.875,0.375 -0.375,1
  rectangle: 0.375,0.375 0.875,1
  lines w0.051: -2,-1 -1.5,-1 ; -2,-0.25 -1.5,-0.25 -1.5,-1 ; -2,1 -1.5,1 -1.5,1.75 ; -1.875,2.125 -1.5,1.75 ; -1.25,-1.375 -1.25,-1 -1.5,-1 ; 1.25,-1.375 1.25,-1 1.5,-1 ; 1.875,2.125 1.5,1.75 ; 2,-1 1.5,-1 ; 2,-0.25 1.5,-0.25 1.5,-1 ; 2,1 1.5,1 1.5,1.75 ; -1.5,1.75 1.5,1.75
  lines w0.203: -2.025,-1.375 -1.25,-1.375 1.25,-1.375 2.025,-1.375 2.025,2.125 1.875,2.125 -1.875,2.125 -2.025,2.125 -2.025,-1.375
Mechanical 16:
  lines w0.203: -2.125,-0.75 -4,-0.75 -4,2.125 -2.125,2.125 ; 2.125,-0.75 4,-0.75 4,2.125 2.125,2.125
  text "1" at 2.5,-0.25 h2.99